# Altium footprint library devices.PCBLIB: 335 footprints (part 7 of 21)
Each footprint in its own frame and in the unit in brackets; x right, y up, seen from the top. Pads: shape width x height; smd on the part's side, far side on the other; paste and mask are expansions set on the pad; w line width, h text height; cw(c..) or ccw(c..) is an arc to the next point about the centre after c.
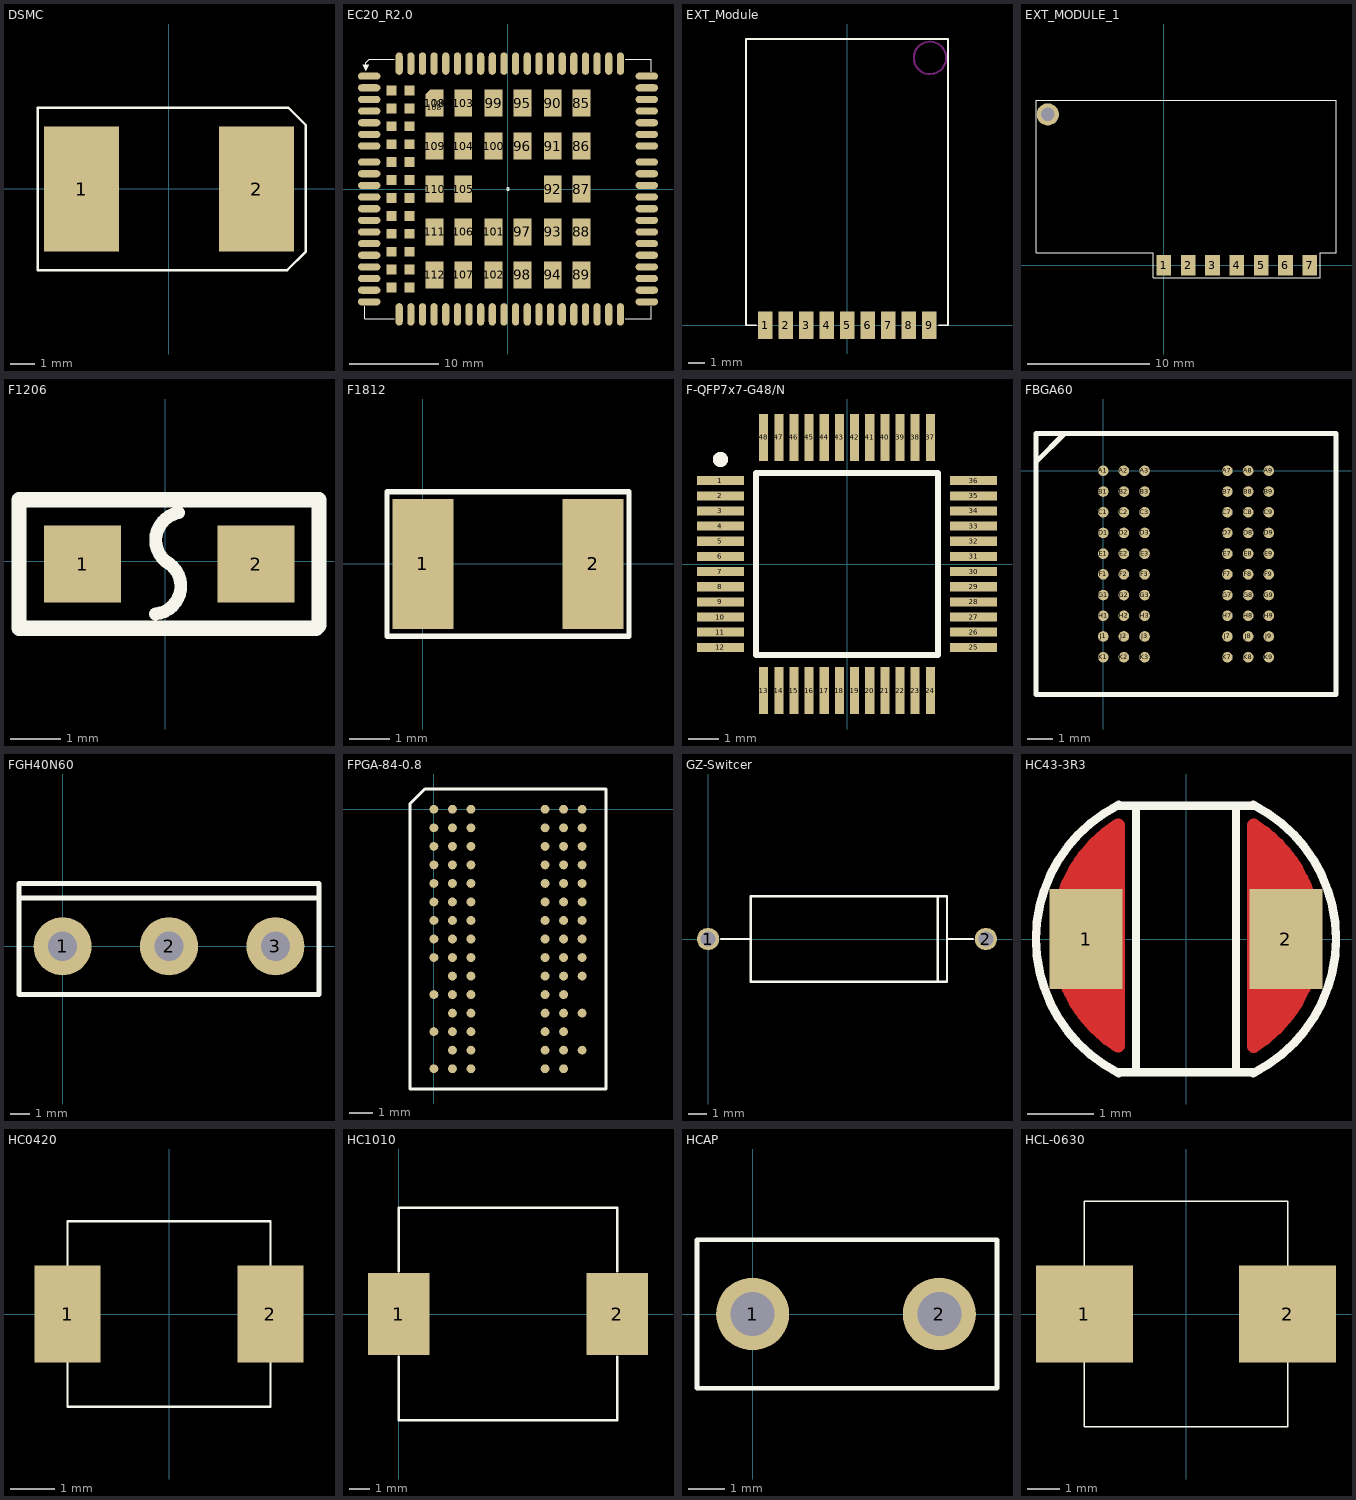
[diagram p6: the footprints below, top view; thin cyan lines are the x and y axes]

## DSMC [mil]
pads (2):
  rect 120x200 smd: 1(-139.76,-0.35) 2(140.24,-0.35)
Top Overlay:
  lines w4: 219.24,98.64 219.24,101.64 ; 219.24,101.64 219.24,44.65 219.24,13.64 219.24,-100.36 189.24,-130.35 163.24,-130.35 -209.76,-130.35 -209.76,129.65 -139.76,129.65 144.24,129.65 191.24,129.65 219.24,101.64

## EC20_R2.0 [mm]
height 6.86
pads (134):
  oval 2.5x0.8 smd: 1(-15.5,12.6) 2(-15.5,11.3) 3(-15.5,10) 4(-15.5,8.7) 5(-15.5,7.4) 6(-15.5,6.1) 7(-15.5,4.8) 8(-15.5,0.4) 9(-15.5,-0.9) 10(-15.5,-2.2) 11(-15.5,-3.5) 12(-15.5,-4.8) 13(-15.5,-6.1) 14(-15.5,-7.4) 15(-15.5,-8.7) 16(-15.5,-10) 17(-15.5,-11.3) 18(-15.5,-12.6) 37(15.5,-12.6) 38(15.5,-11.3) 39(15.5,-10) 40(15.5,-8.7) 41(15.5,-7.4) 42(15.5,-6.1) 43(15.5,-4.8) 44(15.5,-3.5) 45(15.5,-2.2) 46(15.5,-0.9) 47(15.5,0.4) 48(15.5,4.8) 49(15.5,6.1) 50(15.5,7.4) 51(15.5,8.7) 52(15.5,10) 53(15.5,11.3) 54(15.5,12.6) 141(-15.5,3) 142(-15.5,1.7) 143(15.5,1.7) 144(15.5,3)
  oval 0.8x2.5 smd: 19(-9.55,-14) 20(-8.25,-14) 21(-6.95,-14) 22(-5.65,-14) 23(-4.35,-14) 24(-3.05,-14) 25(-1.75,-14) 26(-0.45,-14) 27(0.85,-14) 28(2.15,-14) 29(3.45,-14) 30(4.75,-14) 31(6.05,-14) 32(7.35,-14) 33(8.65,-14) 34(9.95,-14) 35(11.25,-14) 36(12.55,-14) 55(12.55,14) 56(11.25,14) 57(9.95,14) 58(8.65,14) 59(7.35,14) 60(6.05,14) 61(4.75,14) 62(3.45,14) 63(2.15,14) 64(0.85,14) 65(-0.45,14) 66(-1.75,14) 67(-3.05,14) 68(-4.35,14) 69(-5.65,14) 70(-6.95,14) 71(-8.25,14) 72(-9.55,14) 113(-10.85,14) 114(-12.15,14) 115(-10.85,-14) 116(-12.15,-14)
  rect 2x3 smd: 85(8.2,9.6) 86(8.2,4.8) 87(8.2,0) 88(8.2,-4.8) 89(8.2,-9.6) 90(5,9.6) 91(5,4.8) 92(5,0) 93(5,-4.8) 94(5,-9.6) 95(1.6,9.6) 96(1.6,4.8) 97(1.6,-4.8) 98(1.6,-9.6) 99(-1.6,9.6) 100(-1.6,4.8) 101(-1.6,-4.8) 102(-1.6,-9.6) 103(-5,9.6) 104(-5,4.8) 105(-5,0) 106(-5,-4.8) 107(-5,-9.6) 109(-8.2,4.8) 110(-8.2,0) 111(-8.2,-4.8) 112(-8.2,-9.6)
  rect 2x2 smd: 108(-8.2,9.1)
  oct 2x3 smd: 108(-8.2,9.6)
  rect 1x3 smd: 108(-7.7,9.6)
  rect 1.1x1.1 smd: 117(-11,11) 118(-11,9) 119(-11,7) 120(-11,5) 121(-11,3) 122(-11,1) 123(-11,-1) 124(-11,-3) 125(-11,-5) 126(-11,-7) 127(-11,-9) 128(-11,-11) 129(-13,11) 130(-13,9) 131(-13,7) 132(-13,5) 133(-13,3) 134(-13,1) 135(-13,-1) 136(-13,-3) 137(-13,-5) 138(-13,-7) 139(-13,-9) 140(-13,-11)
Top Overlay:
  circle w0.127: c0,0 r0.141
  lines w0.127: -16,-13.1 -16,-14.5 -12.7,-14.5 ; -15.9,13.9 -15.9,14.1 -15.5,14.5 -15,14.5 -12.7,14.5 ; 13.1,-14.5 16,-14.5 16,-13.1 ; 13.1,14.5 16,14.5 16,13.1
  text "▶" at -16.4,13.9 h1.27

## EXT_Module [mm]
pads (9):
  rect 0.9x1.7 smd: 1(-5.08,0) 2(-3.81,0) 3(-2.54,0) 4(-1.27,0) 5(0,0) 6(1.27,0) 7(2.54,0) 8(3.81,0) 9(5.08,0)
Top Overlay:
  lines w0.1: -6.281,17.761 6.253,17.761 6.253,14.035 6.253,0.002 5.677,0.002 ; -6.281,17.764 -6.281,0 -5.651,0
Keep-Out Layer:
  circle w0.127: c5.133,16.593 r1.007

## EXT_MODULE_1 [mm]
pads (8):
  rect 1.2x1.7 smd: 1(0,0) 2(2,0) 3(4,0) 4(6,0) 5(8,0) 6(10,0) 7(12,0)
  round 1.829 hole 1.118: ""(-9.527,12.381)
Top Overlay:
  lines w0.1: -10.497,1.011 -10.497,13.546 -6.771,13.546 14.151,13.546 14.151,1.011 12.853,1.011 12.853,-1.036 -0.845,-1.036 -0.845,1.011 -10.497,1.011

## F1206 [mil] "Chip Capacitor; Body 4.5 x 3.2 mm (LxW typ)"
height 43.31
pads (2):
  rect 60x60 smd: 1(-64.46,-2.13) 2(70.54,-2.13)
Top Overlay:
  lines w10: -7.73,-40.93 ccw(c-9.68,-19.37) 0,0 cw(c14.09,16.44) 10.15,37.73
  lines w12: 96.46,-52.13 117.16,-52.13 119.46,-49.83 119.46,47.87 106.3,47.87 45.54,47.87 -39.46,47.87 -100.39,47.87 -109.61,47.87 -111.58,47.87 -113.94,47.87 -113.94,-52.13 -100.39,-52.13 -39.46,-52.13 45.54,-52.13 106.3,-52.13

## F1812 [mm]
pads (2):
  rect 1.5x3.2 smd: 1(0,0) 2(4.191,0)
Top Overlay:
  lines w0.127: -0.889,-1.78 5.08,-1.78 5.08,1.778 -0.889,1.778 -0.889,-1.75

## F-QFP7x7-G48/N [mm]
pads (48):
  rect 1.55x0.3 smd: 1(-4.175,2.75) 2(-4.175,2.25) 3(-4.175,1.75) 4(-4.175,1.25) 5(-4.175,0.75) 6(-4.175,0.25) 7(-4.175,-0.25) 8(-4.175,-0.75) 9(-4.175,-1.25) 10(-4.175,-1.75) 11(-4.175,-2.25) 12(-4.175,-2.75) 25(4.175,-2.75) 26(4.175,-2.25) 27(4.175,-1.75) 28(4.175,-1.25) 29(4.175,-0.75) 30(4.175,-0.25) 31(4.175,0.25) 32(4.175,0.75) 33(4.175,1.25) 34(4.175,1.75) 35(4.175,2.25) 36(4.175,2.75)
  rect 0.3x1.55 smd: 13(-2.75,-4.175) 14(-2.25,-4.175) 15(-1.75,-4.175) 16(-1.25,-4.175) 17(-0.75,-4.175) 18(-0.25,-4.175) 19(0.25,-4.175) 20(0.75,-4.175) 21(1.25,-4.175) 22(1.75,-4.175) 23(2.25,-4.175) 24(2.75,-4.175) 37(2.75,4.175) 38(2.25,4.175) 39(1.75,4.175) 40(1.25,4.175) 41(0.75,4.175) 42(0.25,4.175) 43(-0.25,4.175) 44(-0.75,4.175) 45(-1.25,4.175) 46(-1.75,4.175) 47(-2.25,4.175) 48(-2.75,4.175)
Top Overlay:
  circle w0.25: c-4.175,3.45 r0.125
  lines w0.2: -3,-3 -3,3 3,3 3,-3 -3,-3

## FBGA60 [mm]
pads (60):
  round 0.41 smd: A1(0,0) A2(0.8,0) A3(1.6,0) A7(4.8,0) A8(5.6,0) A9(6.4,0) B1(0,-0.8) B2(0.8,-0.8) B3(1.6,-0.8) B7(4.8,-0.8) B8(5.6,-0.8) B9(6.4,-0.8) C1(0,-1.6) C2(0.8,-1.6) C3(1.6,-1.6) C7(4.8,-1.6) C8(5.6,-1.6) C9(6.4,-1.6) D1(0,-2.4) D2(0.8,-2.4) D3(1.6,-2.4) D7(4.8,-2.4) D8(5.6,-2.4) D9(6.4,-2.4) E1(0,-3.2) E2(0.8,-3.2) E3(1.6,-3.2) E7(4.8,-3.2) E8(5.6,-3.2) E9(6.4,-3.2) F1(0,-4) F2(0.8,-4) F3(1.6,-4) F7(4.8,-4) F8(5.6,-4) F9(6.4,-4) G1(0,-4.8) G2(0.8,-4.8) G3(1.6,-4.8) G7(4.8,-4.8) G8(5.6,-4.8) G9(6.4,-4.8) H1(0,-5.6) H2(0.8,-5.6) H3(1.6,-5.6) H7(4.8,-5.6) H8(5.6,-5.6) H9(6.4,-5.6) J1(0,-6.4) J2(0.8,-6.4) J3(1.6,-6.4) J7(4.8,-6.4) J8(5.6,-6.4) J9(6.4,-6.4) K1(0,-7.2) K2(0.8,-7.2) K3(1.6,-7.2) K7(4.8,-7.2) K8(5.6,-7.2) K9(6.4,-7.2)
Top Overlay:
  lines w0.2: -2.582,0.354 -1.5,1.437 ; -2.595,-8.637 8.995,-8.637 8.995,1.437 -2.595,1.437 -2.595,-8.637

## FGH40N60 [mm]
pads (3):
  round 3 hole 1.5: 1(0,0) 2(5.5,0) 3(11,0)
Top Overlay:
  lines w0.254: -2.25,2.5 13.25,2.5 ; -2.25,2.5 -2.25,-2.5 13.25,-2.5 13.25,2.5 ; -2.25,2.5 -2.25,3.25 13.25,3.25 13.25,2.5

## FPGA-84-0.8 [mil]
pads (84):
  round 15 smd: A1(0,0) A2(31.49,0) A3(62.99,0) A7(188.97,0) A8(220.47,0) A9(251.96,0) B1(0,-31.49) B2(31.49,-31.49) B3(62.99,-31.49) B7(188.97,-31.49) B8(220.47,-31.49) B9(251.96,-31.49) C1(0,-62.99) C2(31.49,-62.99) C3(62.99,-62.99) C7(188.97,-62.99) C8(220.47,-62.99) C9(251.96,-62.99) D1(0,-94.49) D2(31.49,-94.49) D3(62.99,-94.49) D7(188.97,-94.49) D8(220.47,-94.49) D9(251.96,-94.49) E1(0,-125.98) E2(31.49,-125.98) E3(62.99,-125.98) E7(188.97,-125.98) E8(220.47,-125.98) E9(251.96,-125.98) F1(0,-157.48) F2(31.49,-157.48) F3(62.99,-157.48) F7(188.97,-157.48) F8(220.47,-157.48) F9(251.96,-157.48) G1(0,-188.97) G2(31.49,-188.97) G3(62.99,-188.97) G7(188.97,-188.97) G8(220.47,-188.97) G9(251.96,-188.97) H1(0,-220.47) H2(31.49,-220.47) H3(62.99,-220.47) H7(188.97,-220.47) H8(220.47,-220.47) H9(251.96,-220.47) J1(0,-251.97) J2(31.49,-251.97) J3(62.99,-251.97) J7(188.97,-251.97) J8(220.47,-251.97) J9(251.96,-251.97) K2(31.49,-283.46) K3(62.99,-283.46) K7(188.97,-283.46) K8(220.47,-283.46) K9(251.96,-283.46) L1(0,-314.96) L2(31.49,-314.96) L3(62.99,-314.96) L7(188.97,-314.96) L8(220.47,-314.96) M2(31.49,-346.45) M3(62.99,-346.45) M7(188.97,-346.45) M8(220.47,-346.45) M9(251.96,-346.45) N1(0,-377.95) N2(31.49,-377.95) N3(62.99,-377.95) N7(188.97,-377.95) N8(220.47,-377.95) P2(31.49,-409.45) P3(62.99,-409.45) P7(188.97,-409.45) P8(220.47,-409.45) P9(251.96,-409.45) R1(0,-440.94) R2(31.49,-440.94) R3(62.99,-440.94) R7(188.97,-440.94) R8(220.47,-440.94)
Top Overlay:
  lines w5: -40.48,-475.51 -40.48,9.57 -15.48,34.57 292.44,34.57 292.44,-475.51 -40.48,-475.51

## GZ-Switcer [mm]
pads (2):
  round 1.2 hole 0.8: 1(0,0) 2(15,0)
Top Overlay:
  lines w0.127: 0.7,0 2.3,0 ; 12.4,-2.3 12.4,2.3 ; 12.9,0 14.3,0 ; 2.3,-2.3 12.9,-2.3 12.9,2.3 2.3,2.3 2.3,-2.3

## HC43-3R3 [mm]
pads (2):
  rect 1.1x1.5 smd: 1(-1.5,0) 2(1.5,0)
Top Layer:
  lines w0.203: -1.931,0.013 -1.018,0.013 ; -1.925,0.216 -1.018,0.216 ; -1.917,-0.19 -1.018,-0.19 ; -1.897,0.419 -1.018,0.419 ; -1.881,-0.394 -1.018,-0.394 ; -1.846,0.622 -1.018,0.622 ; -1.821,-0.597 -1.018,-0.597 ; -1.787,-0.688 -1.787,0.79 ; -1.772,0.826 -1.018,0.826 ; -1.737,-0.8 -1.018,-0.8 ; -1.67,1.029 -1.018,1.029 ; -1.623,-1.003 -1.018,-1.003 ; -1.584,-1.063 -1.584,1.165 ; -1.535,1.232 -1.018,1.232 ; -1.474,-1.206 -1.018,-1.206 ; -1.381,-1.31 -1.381,1.412 ; -1.358,1.435 -1.018,1.435 ; -1.277,-1.41 -1.018,-1.41 ; -1.177,-1.492 -1.177,1.594 ; 1.018,-1.335 1.358,-1.335 ; 1.018,-1.132 1.535,-1.132 ; 1.018,-0.929 1.67,-0.929 ; 1.018,-0.726 1.772,-0.726 ; 1.018,-0.522 1.846,-0.522 ; 1.018,-0.319 1.897,-0.319 ; 1.018,-0.116 1.925,-0.116 ; 1.018,0.087 1.931,0.087 ; 1.018,0.29 1.917,0.29 ; 1.018,0.494 1.881,0.494 ; 1.018,0.697 1.821,0.697 ; 1.018,0.9 1.737,0.9 ; 1.018,1.103 1.623,1.103 ; 1.018,1.306 1.474,1.306 ; 1.018,1.51 1.277,1.51 ; 1.177,-1.494 1.177,1.592 ; 1.381,-1.312 1.381,1.41 ; 1.584,-1.065 1.584,1.163 ; 1.787,-0.69 1.787,0.788 ; -1.018,-1.604 cw(c0.024,0.051) -1.018,1.706 -1.018,-1.604 ; 1.018,-1.606 ccw(c-0.024,0.049) 1.018,1.704 1.018,-1.606
Top Overlay:
  lines w0.127: -1.006,-2.012 cw(c0,0) -1.006,2.012 ; -1,-2 1,-2 ; -1,2 1,2 ; -0.75,-2 -0.75,2 ; 0.75,-2 0.75,2 ; 1.006,-2.012 ccw(c0,0) 1.006,2.012
Top Solder:
  lines w0.203: -2.235,0.051 -1,0.051 ; -2.228,-0.152 -1,-0.152 ; -2.219,0.254 -1,0.254 ; -2.198,-0.356 -1,-0.356 ; -2.181,0.457 -1,0.457 ; -2.145,-0.559 -1,-0.559 ; -2.126,-0.613 -2.126,0.638 ; -2.118,0.66 -1,0.66 ; -2.065,-0.762 -1,-0.762 ; -2.027,0.864 -1,0.864 ; -1.955,-0.965 -1,-0.965 ; -1.923,-1.015 -1.923,1.04 ; -1.905,1.067 -1,1.067 ; -1.808,-1.168 -1,-1.168 ; -1.741,1.27 -1,1.27 ; -1.72,-1.267 -1.72,1.293 ; -1.616,-1.372 -1,-1.372 ; -1.539,1.473 -1,1.473 ; -1.516,-1.471 -1.516,1.496 ; -1.413,-1.575 -1,-1.575 ; -1.336,1.676 -1,1.676 ; -1.313,-1.674 -1.313,1.699 ; -1.209,-1.778 -1,-1.778 ; -1.11,-1.877 -1.11,1.903 ; 1,-1.651 1.336,-1.651 ; 1,-1.448 1.539,-1.448 ; 1,-1.245 1.741,-1.245 ; 1,-1.041 1.905,-1.041 ; 1,-0.838 2.027,-0.838 ; 1,-0.635 2.118,-0.635 ; 1,-0.432 2.181,-0.432 ; 1,-0.229 2.219,-0.229 ; 1,-0.025 2.235,-0.025 ; 1,0.178 2.228,0.178 ; 1,0.381 2.198,0.381 ; 1,0.584 2.145,0.584 ; 1,0.787 2.065,0.787 ; 1,0.991 1.955,0.991 ; 1,1.194 1.808,1.194 ; 1,1.397 1.616,1.397 ; 1,1.6 1.413,1.6 ; 1,1.803 1.209,1.803 ; 1.11,-1.877 1.11,1.903 ; 1.313,-1.674 1.313,1.7 ; 1.516,-1.471 1.516,1.496 ; 1.72,-1.267 1.72,1.293 ; 1.923,-1.015 1.923,1.04 ; 2.126,-0.613 2.126,0.638 ; -2.235,0.013 cw(c-0.389,0.013) -1.694,1.318 -1,2.013 -1,-1.987 -1.694,-1.293 cw(c-0.389,0.013) -2.235,0.013 ; 1,-1.987 1.694,-1.293 ccw(c0.389,0.013) 2.235,0.013 ccw(c0.389,0.013) 1.694,1.318 1,2.013 1,-1.987

## HC0420 [mm]
pads (2):
  rect 1.5x2.2 smd: 1(-2.3,0) 2(2.3,0)
Top Overlay:
  lines w0.051: -2.3,-2.1 -2.3,2.1 2.3,2.1 2.3,-2.1 -2.3,-2.1

## HC1010 [mm]
pads (2):
  rect 3x4 smd: 1(0,0) 2(10.7,0)
Top Overlay:
  lines w0.127: 0,-2.1 0,-5.2 10.7,-5.2 10.7,-2.1 ; 0,2.1 0,5.2 10.7,5.2 10.7,2.1

## HCAP [mm]
pads (2):
  round 2 hole 1.2: 1(0,0) 2(5.12,0)
Top Overlay:
  lines w0.127: -1.524,-2.032 -1.524,2.032 6.7,2.032 6.7,-2.032 0.635,-2.032 -1.524,-2.032

## HCL-0630 [mm]
pads (2):
  rect 3x3 smd: 1(-3.15,0) 2(3.15,0)
Top Overlay:
  lines w0.051: -3.15,-3.5 -3.15,3.5 3.15,3.5 3.15,3 3.15,-3.5 -3.15,-3.5